# Altium footprint library ICs And Semiconductors SMD.PcbLib: 943 footprints (part 47 of 60)
Each footprint in its own frame and in the unit in brackets; x right, y up, seen from the top. Pads: shape width x height; smd on the part's side, far side on the other; paste and mask are expansions set on the pad; w line width, h text height; cw(c..) or ccw(c..) is an arc to the next point about the centre after c.
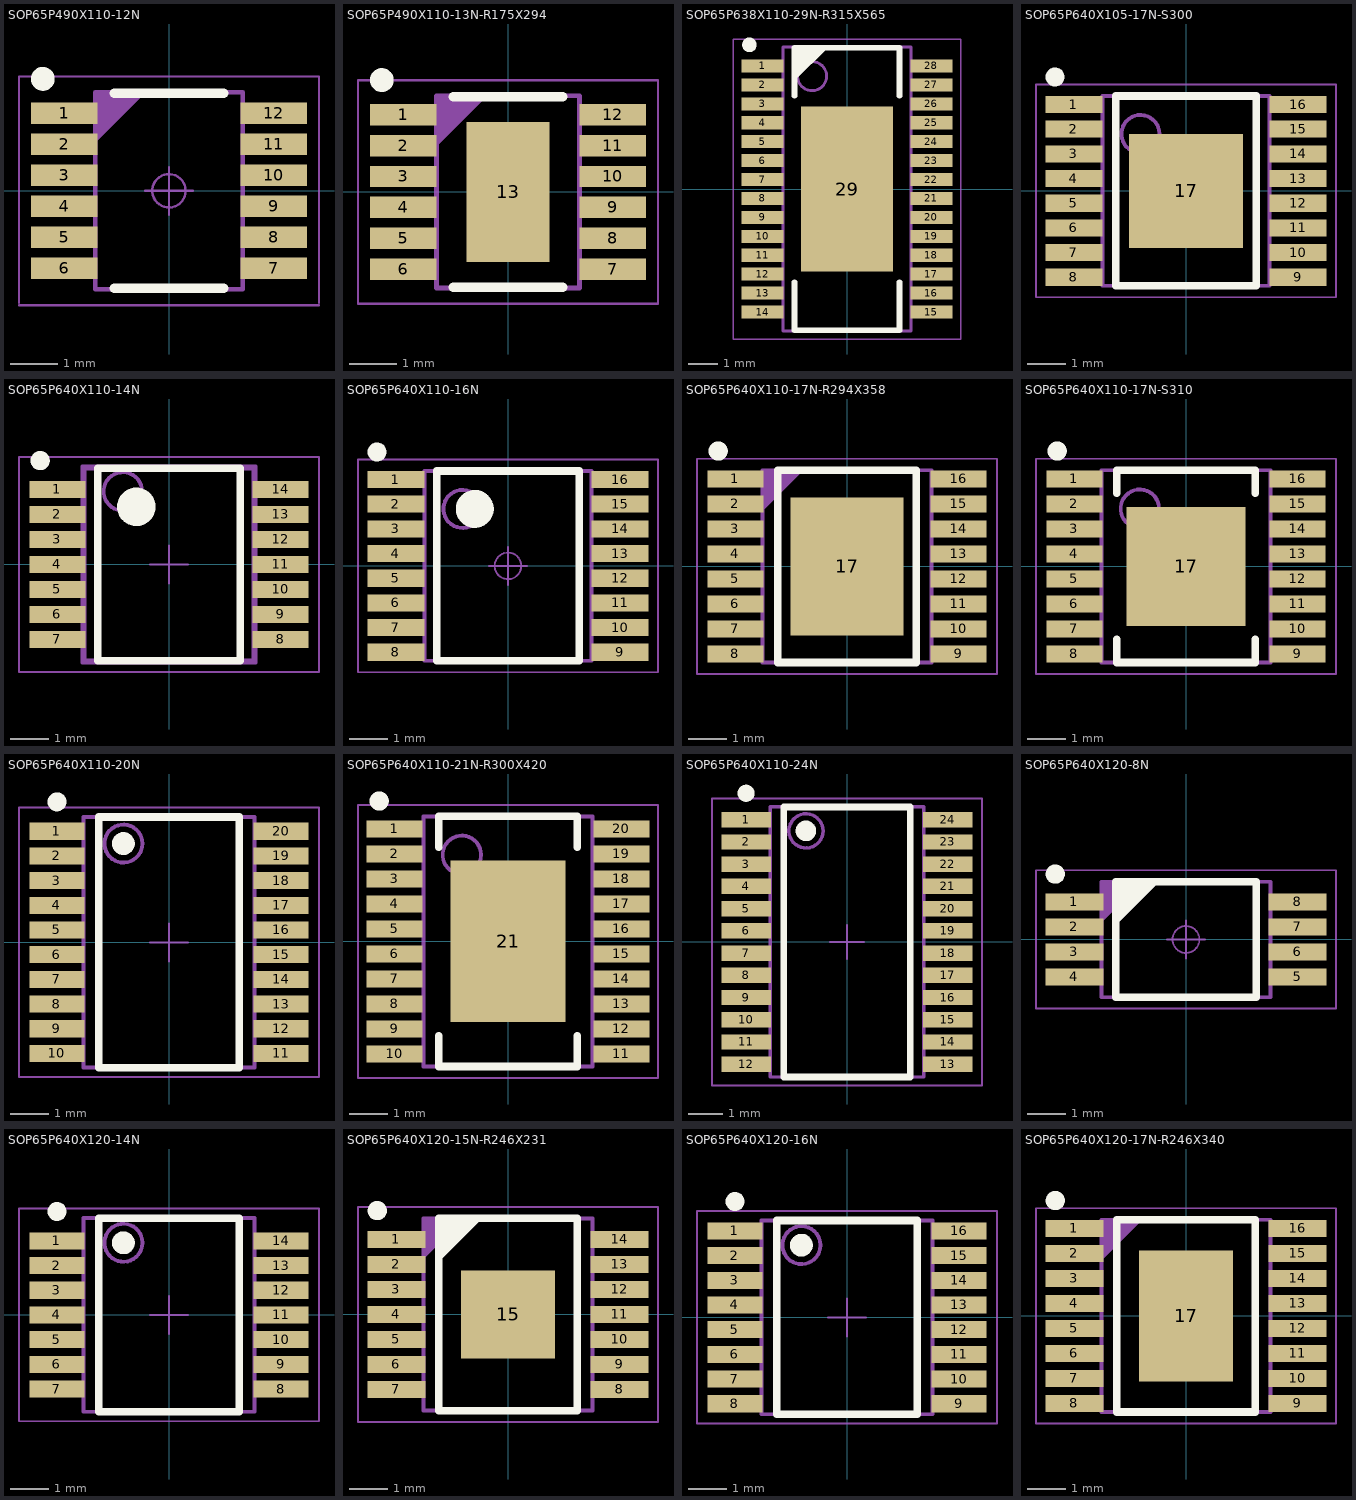
[diagram p46: the footprints below, top view; thin cyan lines are the x and y axes]

## SOP65P490X110-12N [mm] "SOP,0.65mm pitch;12 pin,3.00mm W X 4.039mm L X 1.10mm H body, IPC Medium Density"
height 1.1
pads (12):
  rect 1.4x0.45 smd: 1(-2.2,1.625) 2(-2.2,0.975) 3(-2.2,0.325) 4(-2.2,-0.325) 5(-2.2,-0.975) 6(-2.2,-1.625) 7(2.2,-1.625) 8(2.2,-0.975) 9(2.2,-0.325) 10(2.2,0.325) 11(2.2,0.975) 12(2.2,1.625)
Top Overlay:
  circle w0.25: c-2.65,2.35 r0.125
  lines w0.2: -1.15,-2.05 1.15,-2.05 ; -1.15,2.05 1.15,2.05
Mechanical 14:
  lines w0.1: -1.55,1.069 -0.55,2.069 ; -1.55,1.17 -0.65,2.069 ; -1.55,1.269 -0.75,2.069 ; -1.55,1.37 -0.85,2.069 ; -1.55,1.469 -0.95,2.069 ; -1.55,1.569 -1.05,2.069 ; -1.55,1.67 -1.15,2.069 ; -1.55,1.769 -1.25,2.069 ; -1.55,1.87 -1.35,2.069 ; -1.55,1.969 -1.45,2.069 ; -1.55,-2.069 1.55,-2.069 1.55,2.069 -1.55,2.069 -1.55,-2.069
Mechanical 15:
  circle w0.05: c0,0 r0.35
  lines w0.05: -3.15,-2.4 3.15,-2.4 ; -3.15,-2.35 -3.15,2.4 3.15,2.4 3.15,-2.35 ; -0.5,0 0.5,0 ; 0,-0.5 0,0.5
3D body "SOP65P490X110-12N.stp": height 1.1, standoff 0, extent -2.45,-2.07 2.45,2.071

## SOP65P490X110-13N-R175X294 [mm] "SOP,0.65mm pitch;12 pin,3.00mm W X 4.039mm L X 1.10mm H body, (w/thermal tab 1.75 X 2.94 mm), IPC Medium Density"
height 1.1
pads (13):
  rect 1.4x0.45 smd: 1(-2.2,1.625) 2(-2.2,0.975) 3(-2.2,0.325) 4(-2.2,-0.325) 5(-2.2,-0.975) 6(-2.2,-1.625) 7(2.2,-1.625) 8(2.2,-0.975) 9(2.2,-0.325) 10(2.2,0.325) 11(2.2,0.975) 12(2.2,1.625)
  rect 1.75x2.94 smd: 13(0,0)
Top Overlay:
  circle w0.25: c-2.65,2.35 r0.125
  lines w0.2: -1.15,-2 1.15,-2 ; -1.15,2 1.15,2
Mechanical 14:
  lines w0.1: -1.5,1.019 -0.5,2.019 ; -1.5,1.12 -0.6,2.019 ; -1.5,1.219 -0.7,2.019 ; -1.5,1.32 -0.8,2.019 ; -1.5,1.419 -0.9,2.019 ; -1.5,1.519 -1,2.019 ; -1.5,1.62 -1.1,2.019 ; -1.5,1.719 -1.2,2.019 ; -1.5,1.82 -1.3,2.019 ; -1.5,1.919 -1.4,2.019 ; -1.5,-2.019 1.5,-2.019 1.5,2.019 -1.5,2.019 -1.5,-2.019
Mechanical 15:
  circle w0.05: c0,0 r0.35
  lines w0.05: -0.5,0 0.5,0 ; 0,-0.5 0,0.5 ; -3.15,-2.35 3.15,-2.35 3.15,2.35 -3.15,2.35 -3.15,-2.35
3D body "SOP65P490X110-13N-R175X294.stp": height 1.1, standoff 0, extent -2.45,-2.07 2.45,2.071

## SOP65P638X110-29N-R315X565 [mm] "SOP, 0.65mm Pitch; 28 Pin, 4.40mm W X 9.75mm L X 1.10mm H Body (Thermal tab 3.15 X 5.65mm), IPC Medium Density"
height 1.1
pads (29):
  rect 1.45x0.45 smd: 1(-2.9,4.225) 2(-2.9,3.575) 3(-2.9,2.925) 4(-2.9,2.275) 5(-2.9,1.625) 6(-2.9,0.975) 7(-2.9,0.325) 8(-2.9,-0.325) 9(-2.9,-0.975) 10(-2.9,-1.625) 11(-2.9,-2.275) 12(-2.9,-2.925) 13(-2.9,-3.575) 14(-2.9,-4.225) 15(2.9,-4.225) 16(2.9,-3.575) 17(2.9,-2.925) 18(2.9,-2.275) 19(2.9,-1.625) 20(2.9,-0.975) 21(2.9,-0.325) 22(2.9,0.325) 23(2.9,0.975) 24(2.9,1.625) 25(2.9,2.275) 26(2.9,2.925) 27(2.9,3.575) 28(2.9,4.225)
  rect 3.15x5.65 smd: 29(0,0)
Top Overlay:
  circle w0.25: c-3.35,4.95 r0.125
  lines w0.2: -1.8,-3.2 -1.8,-4.85 1.8,-4.85 1.8,-3.2 ; -1.8,3.2 -1.8,4.85 1.8,4.85 1.8,3.2 ; -1.8,3.85 -0.8,4.85 ; -1.8,4.05 -1,4.85 ; -1.8,4.25 -1.2,4.85 ; -1.8,4.45 -1.4,4.85 ; -1.8,4.65 -1.6,4.85
Top Paste:
  region: -0.85,0.24 0.85,0.24 0.85,2.34 -0.85,2.34
  region: -0.85,-2.34 0.85,-2.34 0.85,-0.24 -0.85,-0.24
Mechanical 14:
  circle w0.1: c-1.2,3.875 r0.5
  lines w0.1: -2.2,-4.875 -2.2,4.875 2.2,4.875 2.2,-4.875 -2.2,-4.875
Mechanical 15:
  circle w0.05: c0,0 r0.35
  lines w0.05: -0.5,0 0.5,0 ; 0,-0.5 0,0.5 ; -3.9,-5.15 -3.9,5.15 3.9,5.15 3.9,-5.15 -3.9,-5.15
3D body "SOP65P638X110-29N-R315X565.stp": height 1.1, standoff 0.01, extent -3.192,-4.9 3.192,4.9

## SOP65P640X105-17N-S300 [mm] "SOP, 0.65mm Pitch; 16 Pin, 4.40mm W X 5.00mm L X 1.05mm H body (w/thermal tab 3.00mm X 3.00mm), IPC Medium Density"
height 1.05
pads (17):
  rect 1.5x0.45 smd: 1(-2.95,2.275) 2(-2.95,1.625) 3(-2.95,0.975) 4(-2.95,0.325) 5(-2.95,-0.325) 6(-2.95,-0.975) 7(-2.95,-1.625) 8(-2.95,-2.275) 9(2.95,-2.275) 10(2.95,-1.625) 11(2.95,-0.975) 12(2.95,-0.325) 13(2.95,0.325) 14(2.95,0.975) 15(2.95,1.625) 16(2.95,2.275)
  rect 3x3 smd: 17(0,0)
Top Overlay:
  circle w0.25: c-3.45,3 r0.125
  lines w0.2: -1.85,-2.5 1.85,-2.5 1.85,2.5 -1.85,2.5 -1.85,-2.5
Mechanical 14:
  circle w0.1: c-1.2,1.5 r0.5
  lines w0.1: -2.2,-2.5 2.2,-2.5 2.2,2.5 -2.2,2.5 -2.2,-2.5
Mechanical 15:
  circle w0.05: c0,0 r0.35
  lines w0.05: -0.5,0 0.5,0 ; 0,-0.5 0,0.5 ; -3.95,-2.8 3.95,-2.8 3.95,2.8 -3.95,2.8 -3.95,-2.8
3D body "SOP65P640X105-17N-S300.stp": height 1.05, standoff 0, extent -3.2,-2.55 3.2,2.55

## SOP65P640X110-14N [mm] "SOP, 14-Leads, Body 4.4x5mm (max), Pitch 0.65mm, IPC Medium Density"
height 1.1
pads (14):
  rect 1.45x0.45 smd: 1(-2.9,1.95) 2(-2.9,1.3) 3(-2.9,0.65) 4(-2.9,0) 5(-2.9,-0.65) 6(-2.9,-1.3) 7(-2.9,-1.95) 8(2.9,-1.95) 9(2.9,-1.3) 10(2.9,-0.65) 11(2.9,0) 12(2.9,0.65) 13(2.9,1.3) 14(2.9,1.95)
Top Overlay:
  circle w0.25: c-3.35,2.7 r0.125
  circle w0.5: c-0.85,1.5 r0.25
  lines w0.2: -1.85,-2.5 -1.85,2.5 1.85,2.5 1.85,-2.5 -1.85,-2.5
Mechanical 14:
  circle w0.1: c-1.2,1.9 r0.5
  lines w0.1: -2.25,-2.55 2.25,-2.55 2.25,2.55 -2.25,2.55 -2.25,-2.55 ; -2.2,-2.5 -2.2,2.5 2.2,2.5 2.2,-2.5 -2.2,-2.5
Mechanical 15:
  lines w0.05: -0.5,0 0.5,0 ; 0,-0.5 0,0.5 ; -3.9,-2.8 -3.9,2.8 3.9,2.8 3.9,-2.8 -3.9,-2.8
3D body "SOP65P640X110-14N.stp": height 1.1, standoff 0, extent -3.121,-2.55 3.121,2.55

## SOP65P640X110-16N [mm] "SOP, 0.65mm pitch; 16 pin, 4.40mm W X 5.00mm L X 1.10mm H body IPC Medium Density"
height 1.1
pads (16):
  rect 1.5x0.45 smd: 1(-2.95,2.275) 2(-2.95,1.625) 3(-2.95,0.975) 4(-2.95,0.325) 5(-2.95,-0.325) 6(-2.95,-0.975) 7(-2.95,-1.625) 8(-2.95,-2.275) 9(2.95,-2.275) 10(2.95,-1.625) 11(2.95,-0.975) 12(2.95,-0.325) 13(2.95,0.325) 14(2.95,0.975) 15(2.95,1.625) 16(2.95,2.275)
Top Overlay:
  circle w0.25: c-3.45,3 r0.125
  circle w0.5: c-0.875,1.5 r0.25
  lines w0.2: -1.875,-2.5 -1.875,2.5 1.875,2.5 1.875,-2.5 -1.875,-2.5
Mechanical 14:
  circle w0.1: c-1.2,1.5 r0.5
  lines w0.1: -2.2,-2.5 -2.2,2.5 2.2,2.5 2.2,-2.5 -2.2,-2.5
Mechanical 15:
  circle w0.05: c0,0 r0.35
  lines w0.05: -0.5,0 0.5,0 ; 0,-0.5 0,0.5 ; -3.95,-2.8 -3.95,2.8 3.95,2.8 3.95,-2.8 -3.95,-2.8
3D body "SOP65P640X110-16N.stp": height 1.1, standoff 0, extent -3.121,-2.55 3.121,2.55

## SOP65P640X110-17N-R294X358 [mm] "SOP, 0.65mm Pitch; 16 Pin, 4.40mm W X 5.00mm L X 1.10mm H body (w/thermal tab 2.94mm X 3.58mm), IPC Medium Density"
height 1.1
pads (17):
  rect 1.45x0.45 smd: 1(-2.9,2.275) 2(-2.9,1.625) 3(-2.9,0.975) 4(-2.9,0.325) 5(-2.9,-0.325) 6(-2.9,-0.975) 7(-2.9,-1.625) 8(-2.9,-2.275) 9(2.9,-2.275) 10(2.9,-1.625) 11(2.9,-0.975) 12(2.9,-0.325) 13(2.9,0.325) 14(2.9,0.975) 15(2.9,1.625) 16(2.9,2.275)
  rect 2.94x3.58 smd: 17(0,0)
Top Overlay:
  circle w0.25: c-3.35,3 r0.125
  lines w0.2: -1.8,-2.5 1.8,-2.5 1.8,2.5 -1.8,2.5 -1.8,-2.5
Mechanical 14:
  lines w0.1: -2.2,1.5 -1.2,2.5 ; -2.2,1.6 -1.3,2.5 ; -2.2,1.7 -1.4,2.5 ; -2.2,1.8 -1.5,2.5 ; -2.2,1.9 -1.6,2.5 ; -2.2,2 -1.7,2.5 ; -2.2,2.1 -1.8,2.5 ; -2.2,2.2 -1.9,2.5 ; -2.2,2.3 -2,2.5 ; -2.2,2.4 -2.1,2.5 ; -2.2,-2.5 2.2,-2.5 2.2,2.5 -2.2,2.5 -2.2,-2.5
Mechanical 15:
  circle w0.05: c0,0 r0.35
  lines w0.05: -0.5,0 0.5,0 ; 0,-0.5 0,0.5 ; -3.9,-2.8 3.9,-2.8 3.9,2.8 -3.9,2.8 -3.9,-2.8
3D body "SOP65P640X110-17N-R294X358.stp": height 1.1, standoff 0, extent -3.2,-2.55 3.2,2.55

## SOP65P640X110-17N-S310 [mm] "SOP, 0.65mm Pitch; 16 Pin, 4.40mm W X 5.00mm L X 1.10mm H body (w/thermal tab 3.10mm X 3.10mm), IPC Medium Density"
height 1.1
pads (17):
  rect 1.45x0.45 smd: 1(-2.9,2.275) 2(-2.9,1.625) 3(-2.9,0.975) 4(-2.9,0.325) 5(-2.9,-0.325) 6(-2.9,-0.975) 7(-2.9,-1.625) 8(-2.9,-2.275) 9(2.9,-2.275) 10(2.9,-1.625) 11(2.9,-0.975) 12(2.9,-0.325) 13(2.9,0.325) 14(2.9,0.975) 15(2.9,1.625) 16(2.9,2.275)
  rect 3.1x3.1 smd paste-0.57: 17(0,0)
Top Overlay:
  circle w0.25: c-3.35,3 r0.125
  lines w0.2: -1.8,-1.9 -1.8,-2.5 1.8,-2.5 1.8,-1.9 ; -1.8,1.9 -1.8,2.5 1.8,2.5 1.8,1.9
Mechanical 14:
  circle w0.1: c-1.2,1.5 r0.5
  lines w0.1: -2.2,-2.5 2.2,-2.5 2.2,2.5 -2.2,2.5 -2.2,-2.5
Mechanical 15:
  circle w0.05: c0,0 r0.35
  lines w0.05: -0.5,0 0.5,0 ; 0,-0.5 0,0.5 ; -3.9,-2.8 3.9,-2.8 3.9,2.8 -3.9,2.8 -3.9,-2.8
3D body "SOP65P640X110-17N-S310.stp": height 1.1, standoff 0, extent -3.2,-2.55 3.2,2.55

## SOP65P640X110-20N [mm] "SOP, 20-Leads, Body 6.6x4.5mm (max), Pitch 0.65mm, IPC Medium Density"
height 1.1
pads (20):
  rect 1.45x0.45 smd: 1(-2.95,2.925) 2(-2.95,2.275) 3(-2.95,1.625) 4(-2.95,0.975) 5(-2.95,0.325) 6(-2.95,-0.325) 7(-2.95,-0.975) 8(-2.95,-1.625) 9(-2.95,-2.275) 10(-2.95,-2.925) 11(2.95,-2.925) 12(2.95,-2.275) 13(2.95,-1.625) 14(2.95,-0.975) 15(2.95,-0.325) 16(2.95,0.325) 17(2.95,0.975) 18(2.95,1.625) 19(2.95,2.275) 20(2.95,2.925)
Top Overlay:
  circle w0.3: c-1.2,2.6 r0.15
  circle w0.25: c-2.95,3.7 r0.125
  lines w0.2: -1.85,-3.3 -1.85,3.3 1.85,3.3 1.85,-3.3 -1.85,-3.3
Mechanical 14:
  circle w0.1: c-1.2,2.6 r0.5
  lines w0.1: -2.25,-3.3 -2.25,3.3 2.25,3.3 2.25,-3.3 -2.25,-3.3
Mechanical 15:
  lines w0.05: -0.5,0 0.5,0 ; 0,-0.5 0,0.5 ; -3.95,-3.55 -3.95,3.55 3.95,3.55 3.95,-3.55 -3.95,-3.55
3D body "SOP65P640X110-20N.stp": height 1.19, standoff 0, extent -3.121,-3.3 3.121,3.3

## SOP65P640X110-21N-R300X420 [mm] "SOP, 0.65mm Pitch; 20 Pin, 4.40mm W X 6.50mm L X 1.10mm H body (w/thermal tab 3mm X 4.2mm  ), IPC Medium Density"
height 1.1
pads (21):
  rect 1.45x0.45 smd: 1(-2.95,2.925) 2(-2.95,2.275) 3(-2.95,1.625) 4(-2.95,0.975) 5(-2.95,0.325) 6(-2.95,-0.325) 7(-2.95,-0.975) 8(-2.95,-1.625) 9(-2.95,-2.275) 10(-2.95,-2.925) 11(2.95,-2.925) 12(2.95,-2.275) 13(2.95,-1.625) 14(2.95,-0.975) 15(2.95,-0.325) 16(2.95,0.325) 17(2.95,0.975) 18(2.95,1.625) 19(2.95,2.275) 20(2.95,2.925)
  rect 3x4.2 smd paste-0.64: 21(0,0)
Top Overlay:
  circle w0.25: c-3.35,3.65 r0.125
  lines w0.2: -1.8,-2.45 -1.8,-3.25 1.8,-3.25 1.8,-2.45 ; -1.8,2.45 -1.8,3.25 1.8,3.25 1.8,2.45
Mechanical 14:
  circle w0.1: c-1.2,2.25 r0.5
  lines w0.1: -2.2,-3.25 2.2,-3.25 2.2,3.25 -2.2,3.25 -2.2,-3.25
Mechanical 15:
  circle w0.05: c0,0 r0.35
  lines w0.05: -0.5,0 0.5,0 ; 0,-0.5 0,0.5 ; -3.9,-3.55 3.9,-3.55 3.9,3.55 -3.9,3.55 -3.9,-3.55
3D body "SOP65P640X110-21N-R300X420.stp": height 1.19, standoff 0, extent -3.121,-3.3 3.121,3.3

## SOP65P640X110-24N [mm] "SOP, 24-Leads, Body 7.9x4.5mm (max), Pitch 0.65mm, IPC Medium Density"
height 1.1
pads (24):
  rect 1.45x0.45 smd: 1(-2.95,3.575) 2(-2.95,2.925) 3(-2.95,2.275) 4(-2.95,1.625) 5(-2.95,0.975) 6(-2.95,0.325) 7(-2.95,-0.325) 8(-2.95,-0.975) 9(-2.95,-1.625) 10(-2.95,-2.275) 11(-2.95,-2.925) 12(-2.95,-3.575) 13(2.95,-3.575) 14(2.95,-2.925) 15(2.95,-2.275) 16(2.95,-1.625) 17(2.95,-0.975) 18(2.95,-0.325) 19(2.95,0.325) 20(2.95,0.975) 21(2.95,1.625) 22(2.95,2.275) 23(2.95,2.925) 24(2.95,3.575)
Top Overlay:
  circle w0.3: c-1.2,3.25 r0.15
  circle w0.25: c-2.95,4.35 r0.125
  lines w0.2: -1.85,-3.95 -1.85,3.95 1.85,3.95 1.85,-3.95 -1.85,-3.95
Mechanical 14:
  circle w0.1: c-1.2,3.25 r0.5
  lines w0.1: -2.25,-3.95 -2.25,3.95 2.25,3.95 2.25,-3.95 -2.25,-3.95
Mechanical 15:
  lines w0.05: -0.5,0 0.5,0 ; 0,-0.5 0,0.5 ; -3.95,-4.2 -3.95,4.2 3.95,4.2 3.95,-4.2 -3.95,-4.2
3D body "SOP65P640X110-24N.stp": height 1.1, standoff 0, extent -3.121,-3.95 3.121,3.95

## SOP65P640X120-8N [mm] "SOP, 0.65mm pitch; 8 pin, 4.40mm W X 3.00mm L X 1.20mm H body, IPC Medium Density"
height 1.2
pads (8):
  rect 1.5x0.45 smd: 1(-2.9,0.975) 2(-2.9,0.325) 3(-2.9,-0.325) 4(-2.9,-0.975) 5(2.9,-0.975) 6(2.9,-0.325) 7(2.9,0.325) 8(2.9,0.975)
Top Overlay:
  circle w0.25: c-3.4,1.7 r0.125
  lines w0.2: -1.825,0.5 -0.825,1.5 ; -1.825,0.7 -1.025,1.5 ; -1.825,0.9 -1.225,1.5 ; -1.825,1.1 -1.425,1.5 ; -1.825,1.3 -1.625,1.5 ; -1.825,-1.5 1.825,-1.5 1.825,1.5 -1.825,1.5 -1.825,-1.5
Mechanical 14:
  lines w0.1: -2.2,0.5 -1.2,1.5 ; -2.2,0.6 -1.3,1.5 ; -2.2,0.7 -1.4,1.5 ; -2.2,0.8 -1.5,1.5 ; -2.2,0.9 -1.6,1.5 ; -2.2,1 -1.7,1.5 ; -2.2,1.1 -1.8,1.5 ; -2.2,1.2 -1.9,1.5 ; -2.2,1.3 -2,1.5 ; -2.2,1.4 -2.1,1.5 ; -2.2,-1.5 2.2,-1.5 2.2,1.5 -2.2,1.5 -2.2,-1.5
Mechanical 15:
  circle w0.05: c0,0 r0.35
  lines w0.05: -0.5,0 0.5,0 ; 0,-0.5 0,0.5 ; -3.9,-1.8 3.9,-1.8 3.9,1.8 -3.9,1.8 -3.9,-1.8
3D body "SOP65P640X120-8N.stp": height 1.2, standoff 0, extent -3.201,-1.55 3.201,1.55

## SOP65P640X120-14N [mm] "SOP, 14-Leads, Body 5.1x4.5mm (max), Pitch 0.65mm, IPC Medium Density"
height 1.2
pads (14):
  rect 1.45x0.45 smd: 1(-2.95,1.95) 2(-2.95,1.3) 3(-2.95,0.65) 4(-2.95,0) 5(-2.95,-0.65) 6(-2.95,-1.3) 7(-2.95,-1.95) 8(2.95,-1.95) 9(2.95,-1.3) 10(2.95,-0.65) 11(2.95,0) 12(2.95,0.65) 13(2.95,1.3) 14(2.95,1.95)
Top Overlay:
  circle w0.3: c-1.2,1.9 r0.15
  circle w0.25: c-2.95,2.725 r0.125
  lines w0.2: -1.85,-2.55 1.85,-2.55 1.85,2.55 -1.85,2.55 -1.85,-2.55
Mechanical 14:
  circle w0.1: c-1.2,1.9 r0.5
  lines w0.1: -2.25,-2.55 2.25,-2.55 2.25,2.55 -2.25,2.55 -2.25,-2.55
Mechanical 15:
  lines w0.05: -0.5,0 0.5,0 ; 0,-0.5 0,0.5 ; -3.95,-2.8 3.95,-2.8 3.95,2.8 -3.95,2.8 -3.95,-2.8
3D body "SOP65P640X120-14N.stp": height 1.2, standoff 0, extent -3.121,-2.55 3.121,2.55

## SOP65P640X120-15N-R246X231 [mm] "SOP, 0.65mm Pitch, 14 Pin, 4.40mm W X 5.0mm L X 1.20mm H body (w/thermal tab 2.46mm X 2.31mm), IPC Medium Density"
height 1.2
pads (15):
  rect 1.5x0.45 smd: 1(-2.9,1.95) 2(-2.9,1.3) 3(-2.9,0.65) 4(-2.9,0) 5(-2.9,-0.65) 6(-2.9,-1.3) 7(-2.9,-1.95) 8(2.9,-1.95) 9(2.9,-1.3) 10(2.9,-0.65) 11(2.9,0) 12(2.9,0.65) 13(2.9,1.3) 14(2.9,1.95)
  rect 2.45x2.3 smd: 15(0,0)
Top Overlay:
  circle w0.25: c-3.4,2.7 r0.125
  lines w0.2: -1.8,1.5 -0.8,2.5 ; -1.8,1.7 -1,2.5 ; -1.8,1.9 -1.2,2.5 ; -1.8,2.1 -1.4,2.5 ; -1.8,2.3 -1.6,2.5 ; -1.8,-2.5 -1.8,2.5 1.8,2.5 1.8,-2.5 -1.8,-2.5
Mechanical 14:
  lines w0.1: -2.2,1.5 -1.2,2.5 ; -2.2,1.6 -1.3,2.5 ; -2.2,1.7 -1.4,2.5 ; -2.2,1.8 -1.5,2.5 ; -2.2,1.9 -1.6,2.5 ; -2.2,2 -1.7,2.5 ; -2.2,2.1 -1.8,2.5 ; -2.2,2.2 -1.9,2.5 ; -2.2,2.3 -2,2.5 ; -2.2,2.4 -2.1,2.5 ; -2.2,-2.5 -2.2,2.5 2.2,2.5 2.2,-2.5 -2.2,-2.5
Mechanical 15:
  circle w0.05: c0,0 r0.35
  lines w0.05: -0.5,0 0.5,0 ; 0,-0.5 0,0.5 ; -3.9,-2.8 -3.9,2.8 3.9,2.8 3.9,-2.8 -3.9,-2.8
3D body "SOP65P640X120-15N-R246X231.stp": height 1.2, standoff 0, extent -3.121,-2.55 3.121,2.55

## SOP65P640X120-16N [mm] "SOP, 0.65mm pitch; 16 pin, 4.40mm W X 5.00mm L X 1.20mm H body IPC Medium Density"
height 1.2
pads (16):
  rect 1.45x0.45 smd: 1(-2.95,2.275) 2(-2.95,1.625) 3(-2.95,0.975) 4(-2.95,0.325) 5(-2.95,-0.325) 6(-2.95,-0.975) 7(-2.95,-1.625) 8(-2.95,-2.275) 9(2.95,-2.275) 10(2.95,-1.625) 11(2.95,-0.975) 12(2.95,-0.325) 13(2.95,0.325) 14(2.95,0.975) 15(2.95,1.625) 16(2.95,2.275)
Top Overlay:
  circle w0.25: c-2.95,3.05 r0.125
  circle w0.3: c-1.2,1.9 r0.15
  lines w0.2: -1.85,-2.55 1.85,-2.55 1.85,2.55 -1.85,2.55 -1.85,-2.55
Mechanical 14:
  circle w0.1: c-1.2,1.9 r0.5
  lines w0.1: -2.25,-2.55 2.25,-2.55 2.25,2.55 -2.25,2.55 -2.25,-2.55
Mechanical 15:
  lines w0.05: -0.5,0 0.5,0 ; 0,-0.5 0,0.5 ; -3.95,-2.8 3.95,-2.8 3.95,2.8 -3.95,2.8 -3.95,-2.8
3D body "SOP65P640X120-16N.stp": height 1.2, standoff 0, extent -3.121,-2.55 3.121,2.55

## SOP65P640X120-17N-R246X340 [mm] "SOP, 0.65mm pitch; 16 pin, 4.40mm W X 5.00mm L X 1.20mm H body (w/thermal tab 2.46mm X 3.4mm), IPC Medium Density"
height 1.2
pads (17):
  rect 1.5x0.45 smd: 1(-2.9,2.275) 2(-2.9,1.625) 3(-2.9,0.975) 4(-2.9,0.325) 5(-2.9,-0.325) 6(-2.9,-0.975) 7(-2.9,-1.625) 8(-2.9,-2.275) 9(2.9,-2.275) 10(2.9,-1.625) 11(2.9,-0.975) 12(2.9,-0.325) 13(2.9,0.325) 14(2.9,0.975) 15(2.9,1.625) 16(2.9,2.275)
  rect 2.45x3.4 smd: 17(0,0)
Top Overlay:
  circle w0.25: c-3.4,3 r0.125
  lines w0.2: -1.8,-2.5 -1.8,2.5 1.8,2.5 1.8,-2.5 -1.8,-2.5
Mechanical 14:
  lines w0.1: -2.2,1.5 -1.2,2.5 ; -2.2,1.6 -1.3,2.5 ; -2.2,1.7 -1.4,2.5 ; -2.2,1.8 -1.5,2.5 ; -2.2,1.9 -1.6,2.5 ; -2.2,2 -1.7,2.5 ; -2.2,2.1 -1.8,2.5 ; -2.2,2.2 -1.9,2.5 ; -2.2,2.3 -2,2.5 ; -2.2,2.4 -2.1,2.5 ; -2.2,-2.5 -2.2,2.5 2.2,2.5 2.2,-2.5 -2.2,-2.5
Mechanical 15:
  circle w0.05: c0,0 r0.35
  lines w0.05: -0.5,0 0.5,0 ; 0,-0.5 0,0.5 ; -3.9,-2.8 -3.9,2.8 3.9,2.8 3.9,-2.8 -3.9,-2.8
3D body "SOP65P640X120-17N-R246X340.stp": height 1.2, standoff 0, extent -3.121,-2.55 3.121,2.55